# Altium footprint library iMag.PcbLib: 77 footprints (part 5 of 5)
Each footprint in its own frame and in the unit in brackets; x right, y up, seen from the top. Pads: shape width x height; smd on the part's side, far side on the other; paste and mask are expansions set on the pad; w line width, h text height; cw(c..) or ccw(c..) is an arc to the next point about the centre after c.
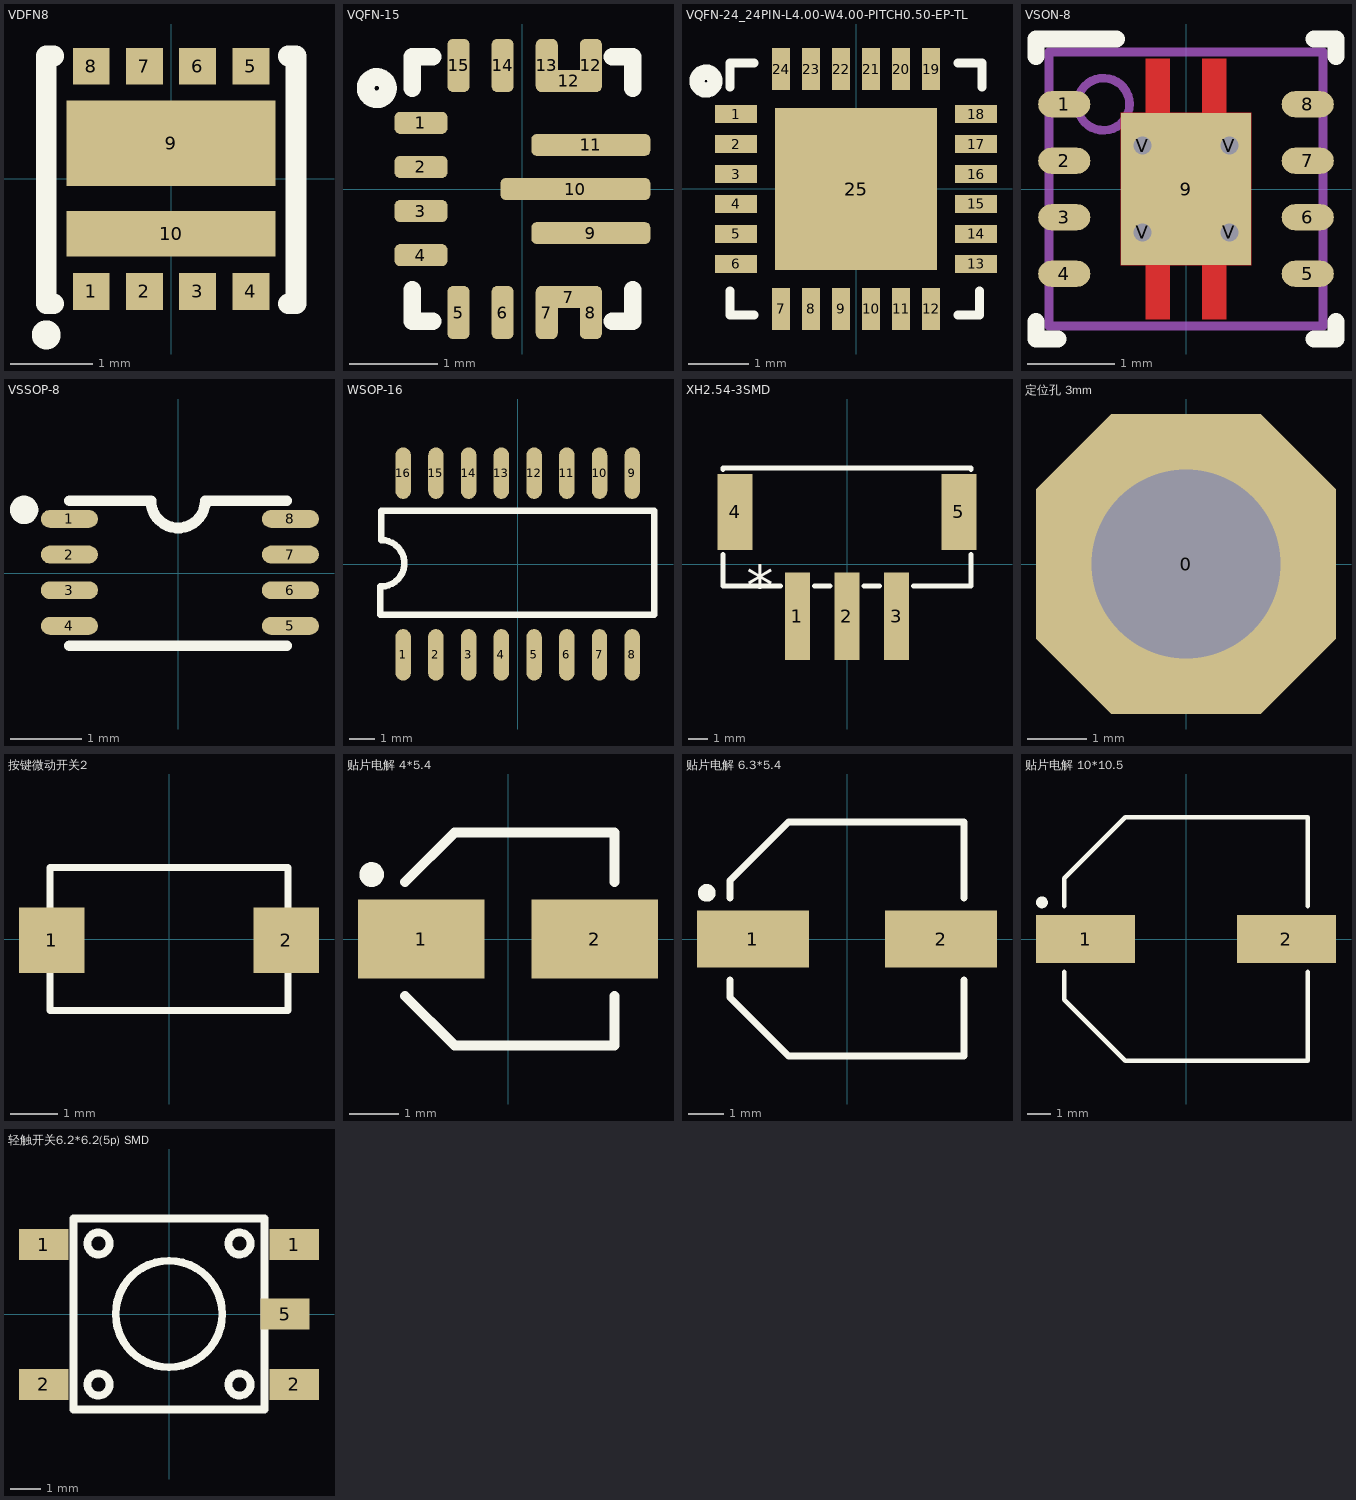
[diagram p4: the footprints below, top view; thin cyan lines are the x and y axes]

## VDFN8 [mm] "V-DFN3030-8K_L3.0-W3.0-P0.65-BL"
pads (10):
  rect 0.45x0.45 smd: 1(-0.975,-1.375) 2(-0.325,-1.375) 3(0.325,-1.375) 4(0.975,-1.375) 5(0.975,1.375) 6(0.325,1.375) 7(-0.325,1.375) 8(-0.975,1.375)
  rect 2.55x1.044 smd: 9(0,0.433)
  rect 2.55x0.556 smd: 10(0,-0.672)
Top Overlay:
  circle w0.254: c-1.524,-1.905 r0.05
  lines w0.15: 1.524,-1.5 1.524,1.5
  lines w0.254: -1.431,-1.524 -1.524,-1.524 -1.524,1.5 -1.431,1.5 ; 1.431,-1.524 1.524,-1.524 1.524,1.5 1.431,1.5
3D body: height 0.8, standoff 0, extent -1.524,-1.524 1.524,1.524

## VQFN-15 [mm]
pads (17):
  rrect50% 0.6x0.25 smd: 1(-1.15,0.75) 2(-1.15,0.25) 3(-1.15,-0.25) 4(-1.15,-0.75)
  rrect50% 0.25x0.6 smd: 5(-0.725,-1.4) 6(-0.225,-1.4) 7(0.275,-1.4) 8(0.775,-1.4) 12(0.775,1.4) 13(0.275,1.4) 14(-0.225,1.4) 15(-0.725,1.4)
  rrect50% 0.75x0.25 smd: 7(0.525,-1.225) 12(0.525,1.225)
  rrect50% 1.35x0.25 smd: 9(0.775,-0.5) 11(0.775,0.5)
  rrect50% 1.7x0.25 smd: 10(0.6,0)
Top Overlay:
  circle w0.2: c-1.651,1.143 r0.127
  lines w0.2: -1.25,-1.143 -1.25,-1.5 -1.016,-1.5 ; -1.25,1.143 -1.25,1.5 -1.016,1.5 ; 1.016,-1.5 1.25,-1.5 1.25,-1.143 ; 1.016,1.5 1.25,1.5 1.25,1.143
3D body "RNM0015A.stp": height 1, standoff 0, extent -1.25,-1.5 1.25,1.5

## VQFN-24_24PIN-L4.00-W4.00-PITCH0.50-EP-TL [mm]
pads (25):
  rect 0.7x0.3 smd: 1(-2,1.25) 2(-2,0.75) 3(-2,0.25) 4(-2,-0.25) 5(-2,-0.75) 6(-2,-1.25) 13(2,-1.25) 14(2,-0.75) 15(2,-0.25) 16(2,0.25) 17(2,0.75) 18(2,1.25)
  rect 0.3x0.7 smd: 7(-1.25,-2) 8(-0.75,-2) 9(-0.25,-2) 10(0.25,-2) 11(0.75,-2) 12(1.25,-2) 19(1.25,2) 20(0.75,2) 21(0.25,2) 22(-0.25,2) 23(-0.75,2) 24(-1.25,2)
  rect 2.7x2.7 smd: 25(-0.001,-0.001)
Top Overlay:
  circle w0.254: c-2.504,1.8 r0.15
  lines w0.15: -2.104,1.7 -2.104,2.1 -1.7,2.1 ; -2.1,-1.7 -2.1,-2.1 -1.7,-2.1 ; 1.696,2.1 2.096,2.1 2.096,1.7 ; 1.7,-2.1 2.059,-2.1 2.059,-1.7
3D body "RGE0024F.stp": height 1, standoff 0, extent -2,-2 2,2

## VSON-8 [mm]
pads (13):
  oval 0.6x0.3 smd paste-0.102 mask+0.051: 1(-1.4,0.975) 2(-1.4,0.325) 3(-1.4,-0.325) 4(-1.4,-0.975) 5(1.4,-0.975) 6(1.4,-0.325) 7(1.4,0.325) 8(1.4,0.975)
  rect 1.5x1.75 smd paste-0.862 mask+0.051: 9(0,0)
  round 0.5 hole 0.203 mask+0.051: V(-0.5,-0.5) V(-0.5,0.5) V(0.5,-0.5) V(0.5,0.5)
Top Layer:
  region: -0.185,-1.5 -0.465,-1.5 -0.465,-0.875 -0.75,-0.875 -0.75,0.875 -0.465,0.875 -0.465,1.5 -0.185,1.5 -0.185,0.875 0.185,0.875 0.185,1.5 0.465,1.5 0.465,0.875 0.75,0.875 0.75,-0.875 0.465,-0.875 0.465,-1.5 0.185,-1.5 0.185,-0.875 -0.185,-0.875
Top Overlay:
  lines w0.2: -1.725,-1.525 -1.725,-1.725 -1.475,-1.725 ; -1.725,1.525 -1.725,1.725 -0.8,1.725 ; 1.475,-1.725 1.725,-1.725 1.725,-1.525 ; 1.475,1.725 1.725,1.725 1.725,1.525
Top Paste:
  region: -0.691,0.793 -0.691,-0.793 0.692,-0.793 0.692,0.793
Mechanical 13:
  circle w0.1: c-0.95,0.975 r0.3
  lines w0.1: -1.575,-1.575 -1.575,1.575 1.575,1.575 1.575,-1.575 -1.575,-1.575
3D body "DRB0008A.stp": height 0.77, standoff 0, extent -1.5,-1.5 1.5,1.5

## VSSOP-8 [mm]
pads (8):
  oval 0.8x0.25 smd mask+0.05: 1(-1.524,0.762) 2(-1.524,0.262) 3(-1.524,-0.238) 4(-1.524,-0.738) 5(1.576,-0.738) 6(1.576,-0.238) 7(1.576,0.262) 8(1.576,0.762)
Top Overlay:
  circle w0.254: c-2.159,0.889 r0.072
  lines w0.152: -1.524,-1.016 1.524,-1.016 ; -1.524,1.016 -0.381,1.016 ccw(c0,1.016) 0.381,1.016 1.524,1.016
3D body "DCU0008A.stp": height 0.77, standoff 0, extent -1.55,-1 1.55,1

## WSOP-16 [mm] "_L10.3-W5.4-P1.27-LS7.8-BL"
pads (16):
  oval 0.6x1.998 smd: 1(-4.446,-3.528) 2(-3.176,-3.528) 3(-1.906,-3.528) 4(-0.636,-3.528) 5(0.634,-3.528) 6(1.904,-3.528) 7(3.174,-3.528) 8(4.444,-3.528) 9(4.446,3.528) 10(3.176,3.528) 11(1.906,3.528) 12(0.636,3.528) 13(-0.634,3.528) 14(-1.904,3.528) 15(-3.174,3.528) 16(-4.446,3.528)
Top Overlay:
  lines w0.254: -5.335,-0.871 -5.335,-1.961 5.299,-1.961 5.299,2.06 -5.299,2.06 -5.299,0.929 cw(c-5.299,0.029) -5.299,-0.871
3D body "User Library-SOP16_208mil (5_3mm).STEP": height 2, standoff 0, extent -5.098,-3.96 5.102,3.961

## XH2.54-3SMD [mm] "CONN-SMD_3P-P2.54_XH2.54-3AB"
pads (5):
  rect 1.3x4.5 smd: 1(-2.54,-2.675) 2(0,-2.675) 3(2.54,-2.675)
  rect 1.801x3.901 smd: 4(-5.741,2.675) 5(5.741,2.675)
Top Overlay:
  lines w0.254: -6.349,0.493 -6.349,-1.135 -3.421,-1.135 ; -6.349,4.857 -6.349,4.925 6.35,4.925 6.35,4.857 ; -1.659,-1.135 -0.881,-1.135 ; 0.881,-1.135 1.659,-1.135 ; 3.421,-1.135 6.35,-1.135 6.35,0.493
  text "*" at -3.759,0.77 h2.03
3D body "User Library-CWF-3.step": height 5.85, standoff 0.15, extent -5.047,-4.869 4.953,5.631

## 定位孔 3mm [mm]
pads (1):
  oct 5.08x5.08 hole 3.2: 0(0,0)
3D body "M3x9+6.STEP": height 9.05, standoff -5.95, extent -2.287,-2.667 2.413,2.729

## 按键微动开关2 [mm]
pads (2):
  rect 1.4x1.4 smd: 1(-2.5,-0.024) 2(2.5,-0.024)
Top Overlay:
  lines w0.15: -2.54,-1.524 -2.54,1.524 2.54,1.524 2.54,-1.524 -2.54,-1.524
3D body "SW-PB 3X4.STEP": height 2.1, standoff -0.05, extent -2.5,-1.524 2.5,1.476

## 贴片电解 4*5.4 [mm] "贴片电解 4*5.4"
pads (2):
  rect 2.55x1.6 smd: 1(-1.75,0) 2(1.75,0)
Top Overlay:
  circle w0.25: c-2.75,1.3 r0.125
  lines w0.2: -2.075,-1.15 -1.075,-2.15 2.15,-2.15 2.15,-1.15 ; -2.075,1.15 -1.075,2.15 2.15,2.15 2.15,1.15
3D body "User Library-CAP SMD SVP 4_0x5_4.STEP": height 5.4, standoff 0, extent -2.5,-2.15 2.5,2.15

## 贴片电解 6.3*5.4 [mm] "贴片电解 6.3*5.4"
pads (2):
  rect 3.15x1.6 smd: 1(-2.65,0) 2(2.65,0)
Top Overlay:
  circle w0.25: c-3.95,1.3 r0.125
  lines w0.2: -3.3,-1.15 -3.3,-1.65 -1.65,-3.3 3.3,-3.3 3.3,-1.15 ; -3.3,1.15 -3.3,1.65 -1.65,3.3 3.3,3.3 3.3,1.15
3D body "User Library-ALU-D.STEP": height 5.4, standoff 0, extent -3.5,-3.3 3.5,3.3

## 贴片电解 10*10.5 [mm]
pads (2):
  rect 4.2x2.05 smd: 1(-4.25,0) 2(4.25,0)
Top Overlay:
  circle w0.25: c-6.1,1.55 r0.125
  lines w0.2: -5.15,-1.4 -5.15,-2.575 -2.575,-5.15 5.15,-5.15 5.15,-1.4 ; -5.15,1.4 -5.15,2.575 -2.575,5.15 5.15,5.15 5.15,1.4
3D body "User Library-ALU-G.STEP": height 10.2, standoff 0, extent -5.8,-5.15 5.8,5.15

## 轻触开关6.2*6.2(5p) SMD [mm]
pads (5):
  rect 1.6x1 smd: 1(-4.064,2.25) 1(4.064,2.25) 2(-4.064,-2.286) 2(4.064,-2.286) 5(3.764,0)
Top Overlay:
  circle w0.254: c2.286,-2.286 r0.359
  circle w0.254: c-2.286,-2.286 r0.359
  circle w0.254: c2.286,2.286 r0.359
  circle w0.254: c-2.286,2.286 r0.359
  circle w0.254: c0,0 r1.727
  lines w0.254: -3.1,-3.1 -3.1,3.1 3.1,3.1 3.1,-3.1 -3.1,-3.1
3D body "User Library-222CMVABR.STEP": height 2.5, standoff 0, extent -4,-3.2 4,3.2